# Altium footprint library IC.PcbLib: 386 footprints (part 5 of 30) (continued)
## BGA324_0.8(15X15) [mm] "BGA, 324-Leads, Body 15x15mm, Pitch 0.8mm" (continued)
Top Overlay:
  circle w0.25: c-8.15,7.35 r0.125
  region: -6.92,7.5 -7.5,6.92 -7.5,7.5
  lines w0.2: -7.5,6.92 -6.92,7.5 ; -7.5,-7.5 7.5,-7.5 7.5,7.5 -7.5,7.5 -7.5,-7.5
Mechanical 13:
  lines w0.1: -7.5,-7.5 7.5,-7.5 7.5,7.5 -7.5,7.5 -7.5,-7.5
Mechanical 15:
  lines w0.05: -8.5,-8.5 8.5,-8.5 8.5,8.5 -8.5,8.5 -8.5,-8.5
  lines w0.1: -0.5,0 0.5,0 ; 0,-0.5 0,0.5
3D body "User Library-TFBGA-324.STEP": height 1.21, standoff 0.01, extent -7.518,-7.5 7.482,7.5

## BGA324_1.0(19x19) [mm]
pads (324):
  round 0.45 smd: A1(-8.5,8.525) A2(-7.5,8.525) A3(-6.5,8.525) A4(-5.5,8.525) A5(-4.5,8.525) A6(-3.5,8.525) A7(-2.5,8.525) A8(-1.5,8.525) A9(-0.5,8.525) A10(0.5,8.525) A11(1.5,8.525) A12(2.5,8.525) A13(3.5,8.525) A14(4.5,8.525) A15(5.5,8.525) A16(6.5,8.525) A17(7.5,8.525) A18(8.5,8.525) B1(-8.5,7.525) B2(-7.5,7.525) B3(-6.5,7.525) B4(-5.5,7.525) B5(-4.5,7.525) B6(-3.5,7.525) B7(-2.5,7.525) B8(-1.5,7.525) B9(-0.5,7.525) B10(0.5,7.525) B11(1.5,7.525) B12(2.5,7.525) B13(3.5,7.525) B14(4.5,7.525) B15(5.5,7.525) B16(6.5,7.525) B17(7.5,7.525) B18(8.5,7.525) C1(-8.5,6.525) C2(-7.5,6.525) C3(-6.5,6.525) C4(-5.5,6.525) C5(-4.5,6.525) C6(-3.5,6.525) C7(-2.5,6.525) C8(-1.5,6.525) C9(-0.5,6.525) C10(0.5,6.525) C11(1.5,6.525) C12(2.5,6.525) C13(3.5,6.525) C14(4.5,6.525) C15(5.5,6.525) C16(6.5,6.525) C17(7.5,6.525) C18(8.5,6.525) D1(-8.5,5.525) D2(-7.5,5.525) D3(-6.5,5.525) D4(-5.5,5.525) D5(-4.5,5.525) D6(-3.5,5.525) D7(-2.5,5.525) D8(-1.5,5.525) D9(-0.5,5.525) D10(0.5,5.525) D11(1.5,5.525) D12(2.5,5.525) D13(3.5,5.525) D14(4.5,5.525) D15(5.5,5.525) D16(6.5,5.525) D17(7.5,5.525) D18(8.5,5.525) E1(-8.5,4.525) E2(-7.5,4.525) E3(-6.5,4.525) E4(-5.5,4.525) E5(-4.5,4.525) E6(-3.5,4.525) E7(-2.5,4.525) E8(-1.5,4.525) E9(-0.5,4.525) E10(0.5,4.525) E11(1.5,4.525) E12(2.5,4.525) E13(3.5,4.525) E14(4.5,4.525) E15(5.5,4.525) E16(6.5,4.525) E17(7.5,4.525) E18(8.5,4.525) F1(-8.5,3.525) F2(-7.5,3.525) F3(-6.5,3.525) F4(-5.5,3.525) F5(-4.5,3.525) F6(-3.5,3.525) F7(-2.5,3.525) F8(-1.5,3.525) F9(-0.5,3.525) F10(0.5,3.525) F11(1.5,3.525) F12(2.5,3.525) F13(3.5,3.525) F14(4.5,3.525) F15(5.5,3.525) F16(6.5,3.525) F17(7.5,3.525) F18(8.5,3.525) G1(-8.5,2.525) G2(-7.5,2.525) G3(-6.5,2.525) G4(-5.5,2.525) G5(-4.5,2.525) G6(-3.5,2.525) G7(-2.5,2.525) G8(-1.5,2.525) G9(-0.5,2.525) G10(0.5,2.525) G11(1.5,2.525) G12(2.5,2.525) G13(3.5,2.525) G14(4.5,2.525) G15(5.5,2.525) G16(6.5,2.525) G17(7.5,2.525) G18(8.5,2.525) H1(-8.5,1.525) H2(-7.5,1.525) H3(-6.5,1.525) H4(-5.5,1.525) H5(-4.5,1.525) H6(-3.5,1.525) H7(-2.5,1.525) H8(-1.5,1.525) H9(-0.5,1.525) H10(0.5,1.525) H11(1.5,1.525) H12(2.5,1.525) H13(3.5,1.525) H14(4.5,1.525) H15(5.5,1.525) H16(6.5,1.525) H17(7.5,1.525) H18(8.5,1.525) J1(-8.5,0.525) J2(-7.5,0.525) J3(-6.5,0.525) J4(-5.5,0.525) J5(-4.5,0.525) J6(-3.5,0.525) J7(-2.5,0.525) J8(-1.5,0.525) J9(-0.5,0.525) J10(0.5,0.525) J11(1.5,0.525) J12(2.5,0.525) J13(3.5,0.525) J14(4.5,0.525) J15(5.5,0.525) J16(6.5,0.525) J17(7.5,0.525) J18(8.5,0.525) K1(-8.5,-0.475) K2(-7.5,-0.475) K3(-6.5,-0.475) K4(-5.5,-0.475) K5(-4.5,-0.475) K6(-3.5,-0.475) K7(-2.5,-0.475) K8(-1.5,-0.475) K9(-0.5,-0.475) K10(0.5,-0.475) K11(1.5,-0.475) K12(2.5,-0.475) K13(3.5,-0.475) K14(4.5,-0.475) K15(5.5,-0.475) K16(6.5,-0.475) K17(7.5,-0.475) K18(8.5,-0.475) L1(-8.5,-1.475) L2(-7.5,-1.475) L3(-6.5,-1.475) L4(-5.5,-1.475) L5(-4.5,-1.475) L6(-3.5,-1.475) L7(-2.5,-1.475) L8(-1.5,-1.475) L9(-0.5,-1.475) L10(0.5,-1.475) L11(1.5,-1.475) L12(2.5,-1.475) L13(3.5,-1.475) L14(4.5,-1.475) L15(5.5,-1.475) L16(6.5,-1.475) L17(7.5,-1.475) L18(8.5,-1.475) M1(-8.5,-2.475) M2(-7.5,-2.475) M3(-6.5,-2.475) M4(-5.5,-2.475) M5(-4.5,-2.475) M6(-3.5,-2.475) M7(-2.5,-2.475) M8(-1.5,-2.475) M9(-0.5,-2.475) M10(0.5,-2.475) M11(1.5,-2.475) M12(2.5,-2.475) M13(3.5,-2.475) M14(4.5,-2.475) M15(5.5,-2.475) M16(6.5,-2.475) M17(7.5,-2.475) M18(8.5,-2.475) N1(-8.5,-3.475) N2(-7.5,-3.475) N3(-6.5,-3.475) N4(-5.5,-3.475) N5(-4.5,-3.475) N6(-3.5,-3.475) N7(-2.5,-3.475) N8(-1.5,-3.475) N9(-0.5,-3.475) N10(0.5,-3.475) N11(1.5,-3.475) N12(2.5,-3.475) N13(3.5,-3.475) N14(4.5,-3.475) N15(5.5,-3.475) N16(6.5,-3.475) N17(7.5,-3.475) N18(8.5,-3.475) P1(-8.5,-4.475) P2(-7.5,-4.475) P3(-6.5,-4.475) P4(-5.5,-4.475) P5(-4.5,-4.475) P6(-3.5,-4.475) P7(-2.5,-4.475) P8(-1.5,-4.475) P9(-0.5,-4.475) P10(0.5,-4.475) P11(1.5,-4.475) P12(2.5,-4.475) P13(3.5,-4.475) P14(4.5,-4.475) P15(5.5,-4.475) P16(6.5,-4.475) P17(7.5,-4.475) P18(8.5,-4.475) R1(-8.5,-5.475) R2(-7.5,-5.475) R3(-6.5,-5.475) R4(-5.5,-5.475) R5(-4.5,-5.475) R6(-3.5,-5.475) R7(-2.5,-5.475) R8(-1.5,-5.475) R9(-0.5,-5.475) R10(0.5,-5.475) R11(1.5,-5.475) R12(2.5,-5.475) R13(3.5,-5.475) R14(4.5,-5.475) R15(5.5,-5.475) R16(6.5,-5.475) R17(7.5,-5.475) R18(8.5,-5.475) T1(-8.5,-6.475) T2(-7.5,-6.475) T3(-6.5,-6.475) T4(-5.5,-6.475) T5(-4.5,-6.475) T6(-3.5,-6.475) T7(-2.5,-6.475) T8(-1.5,-6.475) T9(-0.5,-6.475) T10(0.5,-6.475) T11(1.5,-6.475) T12(2.5,-6.475) T13(3.5,-6.475) T14(4.5,-6.475) T15(5.5,-6.475) T16(6.5,-6.475) T17(7.5,-6.475) T18(8.5,-6.475) U1(-8.5,-7.475) U2(-7.5,-7.475) U3(-6.5,-7.475) U4(-5.5,-7.475) U5(-4.5,-7.475) U6(-3.5,-7.475) U7(-2.5,-7.475) U8(-1.5,-7.475) U9(-0.5,-7.475) U10(0.5,-7.475) U11(1.5,-7.475) U12(2.5,-7.475) U13(3.5,-7.475) U14(4.5,-7.475) U15(5.5,-7.475) U16(6.5,-7.475) U17(7.5,-7.475) U18(8.5,-7.475) V1(-8.5,-8.475) V2(-7.5,-8.475) V3(-6.5,-8.475) V4(-5.5,-8.475) V5(-4.5,-8.475) V6(-3.5,-8.475) V7(-2.5,-8.475) V8(-1.5,-8.475) V9(-0.5,-8.475) V10(0.5,-8.475) V11(1.5,-8.475) V12(2.5,-8.475) V13(3.5,-8.475) V14(4.5,-8.475) V15(5.5,-8.475) V16(6.5,-8.475) V17(7.5,-8.475) V18(8.5,-8.475)
Top Overlay:
  circle w0.25: c-10.15,9.375 r0.125
  region: -8.5,9.525 -9.5,8.525 -9.5,9.525
  lines w0.2: -9.5,8.525 -8.5,9.525 ; -9.5,-9.475 -9.5,9.525 9.5,9.525 9.5,-9.475 -9.5,-9.475
Mechanical 13:
  lines w0.1: -9.5,-9.475 -9.5,9.525 9.5,9.525 9.5,-9.475 -9.5,-9.475
Mechanical 15:
  lines w0.05: -10,-9.975 -10,10.025 10,10.025 10,-9.975 -10,-9.975
  lines w0.1: -0.5,0.025 0.5,0.025 ; 0,-0.475 0,0.525
3D body "BGA324C100P18X18_1900X1900X150.step": height 1.5, standoff 0, extent -9.525,-9.5 9.475,9.5

## BGA400_0.8(17x17) [mm]
height 1
pads (400):
  round 0.45 smd: A1(-7.575,7.6) A2(-6.775,7.6) A3(-5.975,7.6) A4(-5.175,7.6) A5(-4.375,7.6) A6(-3.575,7.6) A7(-2.775,7.6) A8(-1.975,7.6) A9(-1.175,7.6) A10(-0.375,7.6) A11(0.425,7.6) A12(1.225,7.6) A13(2.025,7.6) A14(2.825,7.6) A15(3.625,7.6) A16(4.425,7.6) A17(5.225,7.6) A18(6.025,7.6) A19(6.825,7.6) A20(7.625,7.6) B1(-7.575,6.8) B2(-6.775,6.8) B3(-5.975,6.8) B4(-5.175,6.8) B5(-4.375,6.8) B6(-3.575,6.8) B7(-2.775,6.8) B8(-1.975,6.8) B9(-1.175,6.8) B10(-0.375,6.8) B11(0.425,6.8) B12(1.225,6.8) B13(2.025,6.8) B14(2.825,6.8) B15(3.625,6.8) B16(4.425,6.8) B17(5.225,6.8) B18(6.025,6.8) B19(6.825,6.8) B20(7.625,6.8) C1(-7.575,6) C2(-6.775,6) C3(-5.975,6) C4(-5.175,6) C5(-4.375,6) C6(-3.575,6) C7(-2.775,6) C8(-1.975,6) C9(-1.175,6) C10(-0.375,6) C11(0.425,6) C12(1.225,6) C13(2.025,6) C14(2.825,6) C15(3.625,6) C16(4.425,6) C17(5.225,6) C18(6.025,6) C19(6.825,6) C20(7.625,6) D1(-7.575,5.2) D2(-6.775,5.2) D3(-5.975,5.2) D4(-5.175,5.2) D5(-4.375,5.2) D6(-3.575,5.2) D7(-2.775,5.2) D8(-1.975,5.2) D9(-1.175,5.2) D10(-0.375,5.2) D11(0.425,5.2) D12(1.225,5.2) D13(2.025,5.2) D14(2.825,5.2) D15(3.625,5.2) D16(4.425,5.2) D17(5.225,5.2) D18(6.025,5.2) D19(6.825,5.2) D20(7.625,5.2) E1(-7.575,4.4) E2(-6.775,4.4) E3(-5.975,4.4) E4(-5.175,4.4) E5(-4.375,4.4) E6(-3.575,4.4) E7(-2.775,4.4) E8(-1.975,4.4) E9(-1.175,4.4) E10(-0.375,4.4) E11(0.425,4.4) E12(1.225,4.4) E13(2.025,4.4) E14(2.825,4.4) E15(3.625,4.4) E16(4.425,4.4) E17(5.225,4.4) E18(6.025,4.4) E19(6.825,4.4) E20(7.625,4.4) F1(-7.575,3.6) F2(-6.775,3.6) F3(-5.975,3.6) F4(-5.175,3.6) F5(-4.375,3.6) F6(-3.575,3.6) F7(-2.775,3.6) F8(-1.975,3.6) F9(-1.175,3.6) F10(-0.375,3.6) F11(0.425,3.6) F12(1.225,3.6) F13(2.025,3.6) F14(2.825,3.6) F15(3.625,3.6) F16(4.425,3.6) F17(5.225,3.6) F18(6.025,3.6) F19(6.825,3.6) F20(7.625,3.6) G1(-7.575,2.8) G2(-6.775,2.8) G3(-5.975,2.8) G4(-5.175,2.8) G5(-4.375,2.8) G6(-3.575,2.8) G7(-2.775,2.8) G8(-1.975,2.8) G9(-1.175,2.8) G10(-0.375,2.8) G11(0.425,2.8) G12(1.225,2.8) G13(2.025,2.8) G14(2.825,2.8) G15(3.625,2.8) G16(4.425,2.8) G17(5.225,2.8) G18(6.025,2.8) G19(6.825,2.8) G20(7.625,2.8) H1(-7.575,2) H2(-6.775,2) H3(-5.975,2) H4(-5.175,2) H5(-4.375,2) H6(-3.575,2) H7(-2.775,2) H8(-1.975,2) H9(-1.175,2) H10(-0.375,2) H11(0.425,2) H12(1.225,2) H13(2.025,2) H14(2.825,2) H15(3.625,2) H16(4.425,2) H17(5.225,2) H18(6.025,2) H19(6.825,2) H20(7.625,2) J1(-7.575,1.2) J2(-6.775,1.2) J3(-5.975,1.2) J4(-5.175,1.2) J5(-4.375,1.2) J6(-3.575,1.2) J7(-2.775,1.2) J8(-1.975,1.2) J9(-1.175,1.2) J10(-0.375,1.2) J11(0.425,1.2) J12(1.225,1.2) J13(2.025,1.2) J14(2.825,1.2) J15(3.625,1.2) J16(4.425,1.2) J17(5.225,1.2) J18(6.025,1.2) J19(6.825,1.2) J20(7.625,1.2) K1(-7.575,0.4) K2(-6.775,0.4) K3(-5.975,0.4) K4(-5.175,0.4) K5(-4.375,0.4) K6(-3.575,0.4) K7(-2.775,0.4) K8(-1.975,0.4) K9(-1.175,0.4) K10(-0.375,0.4) K11(0.425,0.4) K12(1.225,0.4) K13(2.025,0.4) K14(2.825,0.4) K15(3.625,0.4) K16(4.425,0.4) K17(5.225,0.4) K18(6.025,0.4) K19(6.825,0.4) K20(7.625,0.4) L1(-7.575,-0.4) L2(-6.775,-0.4) L3(-5.975,-0.4) L4(-5.175,-0.4) L5(-4.375,-0.4) L6(-3.575,-0.4) L7(-2.775,-0.4) L8(-1.975,-0.4) L9(-1.175,-0.4) L10(-0.375,-0.4) L11(0.425,-0.4) L12(1.225,-0.4) L13(2.025,-0.4) L14(2.825,-0.4) L15(3.625,-0.4) L16(4.425,-0.4) L17(5.225,-0.4) L18(6.025,-0.4) L19(6.825,-0.4) L20(7.625,-0.4) M1(-7.575,-1.2) M2(-6.775,-1.2) M3(-5.975,-1.2) M4(-5.175,-1.2) M5(-4.375,-1.2) M6(-3.575,-1.2) M7(-2.775,-1.2) M8(-1.975,-1.2) M9(-1.175,-1.2) M10(-0.375,-1.2) M11(0.425,-1.2) M12(1.225,-1.2) M13(2.025,-1.2) M14(2.825,-1.2) M15(3.625,-1.2) M16(4.425,-1.2) M17(5.225,-1.2) M18(6.025,-1.2) M19(6.825,-1.2) M20(7.625,-1.2) N1(-7.575,-2) N2(-6.775,-2) N3(-5.975,-2) N4(-5.175,-2) N5(-4.375,-2) N6(-3.575,-2) N7(-2.775,-2) N8(-1.975,-2) N9(-1.175,-2) N10(-0.375,-2) N11(0.425,-2) N12(1.225,-2) N13(2.025,-2) N14(2.825,-2) N15(3.625,-2) N16(4.425,-2) N17(5.225,-2) N18(6.025,-2) N19(6.825,-2) N20(7.625,-2) P1(-7.575,-2.8) P2(-6.775,-2.8) P3(-5.975,-2.8) P4(-5.175,-2.8) P5(-4.375,-2.8) P6(-3.575,-2.8) P7(-2.775,-2.8) P8(-1.975,-2.8) P9(-1.175,-2.8) P10(-0.375,-2.8) P11(0.425,-2.8) P12(1.225,-2.8) P13(2.025,-2.8) P14(2.825,-2.8) P15(3.625,-2.8) P16(4.425,-2.8) P17(5.225,-2.8) P18(6.025,-2.8) P19(6.825,-2.8) P20(7.625,-2.8) R1(-7.575,-3.6) R2(-6.775,-3.6) R3(-5.975,-3.6) R4(-5.175,-3.6) R5(-4.375,-3.6) R6(-3.575,-3.6) R7(-2.775,-3.6) R8(-1.975,-3.6) R9(-1.175,-3.6) R10(-0.375,-3.6) R11(0.425,-3.6) R12(1.225,-3.6) R13(2.025,-3.6) R14(2.825,-3.6) R15(3.625,-3.6) R16(4.425,-3.6) R17(5.225,-3.6) R18(6.025,-3.6) R19(6.825,-3.6) R20(7.625,-3.6) T1(-7.575,-4.4) T2(-6.775,-4.4) T3(-5.975,-4.4) T4(-5.175,-4.4) T5(-4.375,-4.4) T6(-3.575,-4.4) T7(-2.775,-4.4) T8(-1.975,-4.4) T9(-1.175,-4.4) T10(-0.375,-4.4) T11(0.425,-4.4) T12(1.225,-4.4) T13(2.025,-4.4) T14(2.825,-4.4) T15(3.625,-4.4) T16(4.425,-4.4) T17(5.225,-4.4) T18(6.025,-4.4) T19(6.825,-4.4) T20(7.625,-4.4) U1(-7.575,-5.2) U2(-6.775,-5.2) U3(-5.975,-5.2) U4(-5.175,-5.2) U5(-4.375,-5.2) U6(-3.575,-5.2) U7(-2.775,-5.2) U8(-1.975,-5.2) U9(-1.175,-5.2) U10(-0.375,-5.2) U11(0.425,-5.2) U12(1.225,-5.2) U13(2.025,-5.2) U14(2.825,-5.2) U15(3.625,-5.2) U16(4.425,-5.2) U17(5.225,-5.2) U18(6.025,-5.2) U19(6.825,-5.2) U20(7.625,-5.2) V1(-7.575,-6) V2(-6.775,-6) V3(-5.975,-6) V4(-5.175,-6) V5(-4.375,-6) V6(-3.575,-6) V7(-2.775,-6) V8(-1.975,-6) V9(-1.175,-6) V10(-0.375,-6) V11(0.425,-6) V12(1.225,-6) V13(2.025,-6) V14(2.825,-6) V15(3.625,-6) V16(4.425,-6) V17(5.225,-6) V18(6.025,-6) V19(6.825,-6) V20(7.625,-6) W1(-7.575,-6.8) W2(-6.775,-6.8) W3(-5.975,-6.8) W4(-5.175,-6.8) W5(-4.375,-6.8) W6(-3.575,-6.8) W7(-2.775,-6.8) W8(-1.975,-6.8) W9(-1.175,-6.8) W10(-0.375,-6.8) W11(0.425,-6.8) W12(1.225,-6.8) W13(2.025,-6.8) W14(2.825,-6.8) W15(3.625,-6.8) W16(4.425,-6.8) W17(5.225,-6.8) W18(6.025,-6.8) W19(6.825,-6.8) W20(7.625,-6.8) Y1(-7.575,-7.6) Y2(-6.775,-7.6) Y3(-5.975,-7.6) Y4(-5.175,-7.6) Y5(-4.375,-7.6) Y6(-3.575,-7.6) Y7(-2.775,-7.6) Y8(-1.975,-7.6) Y9(-1.175,-7.6) Y10(-0.375,-7.6) Y11(0.425,-7.6) Y12(1.225,-7.6) Y13(2.025,-7.6) Y14(2.825,-7.6) Y15(3.625,-7.6) Y16(4.425,-7.6) Y17(5.225,-7.6) Y18(6.025,-7.6) Y19(6.825,-7.6) Y20(7.625,-7.6)
Top Overlay:
  circle w0.25: c-9.125,8.35 r0.125
  region: -7.558,8.5 -8.475,7.584 -8.475,8.5
  lines w0.2: -8.475,7.584 -7.558,8.5 ; -8.475,-8.5 8.525,-8.5 8.525,8.5 -8.475,8.5 -8.475,-8.5
Mechanical 13:
  lines w0.1: -8.475,-8.5 8.525,-8.5 8.525,8.5 -8.475,8.5 -8.475,-8.5
Mechanical 15:
  lines w0.05: -8.975,-9 9.025,-9 9.025,9 -8.975,9 -8.975,-9
  lines w0.1: -0.475,0 0.525,0 ; 0.025,-0.5 0.025,0.5
3D body "BGA400C80P20X20_1700X1700X150.step": height 1.5, standoff 0, extent -8.525,-8.475 8.475,8.525

## BGA484_0.5(15x15) [mm]
pads (484):
  round 0.25 smd: A1(-6.775,6.775) A2(-6.275,6.775) A3(-5.775,6.775) A4(-5.275,6.775) A5(-4.775,6.775) A7(-3.775,6.775) A8(-3.275,6.775) A9(-2.775,6.775) A10(-2.275,6.775) A12(-1.275,6.775) A13(-0.775,6.775) A16(0.725,6.775) A17(1.225,6.775) A19(2.225,6.775) A20(2.725,6.775) A21(3.225,6.775) A22(3.725,6.775) A24(4.725,6.775) A25(5.225,6.775) A26(5.725,6.775) A27(6.225,6.775) A28(6.725,6.775) AA1(-6.775,-3.225) AA3(-5.775,-3.225) AA4(-5.275,-3.225) AA5(-4.775,-3.225) AA6(-4.275,-3.225) AA7(-3.775,-3.225) AA8(-3.275,-3.225) AA9(-2.775,-3.225) AA10(-2.275,-3.225) AA12(-1.275,-3.225) AA13(-0.775,-3.225) AA16(0.725,-3.225) AA17(1.225,-3.225) AA19(2.225,-3.225) AA20(2.725,-3.225) AA21(3.225,-3.225) AA22(3.725,-3.225) AA23(4.225,-3.225) AA24(4.725,-3.225) AA25(5.225,-3.225) AA26(5.725,-3.225) AA28(6.725,-3.225) AB1(-6.775,-3.725) AB3(-5.775,-3.725) AB4(-5.275,-3.725) AB5(-4.775,-3.725) AB6(-4.275,-3.725) AB7(-3.775,-3.725) AB8(-3.275,-3.725) AB9(-2.775,-3.725) AB10(-2.275,-3.725) AB12(-1.275,-3.725) AB13(-0.775,-3.725) AB16(0.725,-3.725) AB17(1.225,-3.725) AB19(2.225,-3.725) AB20(2.725,-3.725) AB21(3.225,-3.725) AB22(3.725,-3.725) AB23(4.225,-3.725) AB24(4.725,-3.725) AB25(5.225,-3.725) AB26(5.725,-3.725) AB28(6.725,-3.725) AC1(-6.775,-4.225) AC7(-3.775,-4.225) AC8(-3.275,-4.225) AC9(-2.775,-4.225) AC10(-2.275,-4.225) AC12(-1.275,-4.225) AC13(-0.775,-4.225) AC16(0.725,-4.225) AC17(1.225,-4.225) AC19(2.225,-4.225) AC20(2.725,-4.225) AC21(3.225,-4.225) AC22(3.725,-4.225) AC28(6.725,-4.225) AD1(-6.775,-4.725) AD3(-5.775,-4.725) AD4(-5.275,-4.725) AD5(-4.775,-4.725) AD7(-3.775,-4.725) AD8(-3.275,-4.725) AD9(-2.775,-4.725) AD10(-2.275,-4.725) AD12(-1.275,-4.725) AD13(-0.775,-4.725) AD16(0.725,-4.725) AD17(1.225,-4.725) AD19(2.225,-4.725) AD20(2.725,-4.725) AD21(3.225,-4.725) AD22(3.725,-4.725) AD24(4.725,-4.725) AD25(5.225,-4.725) AD26(5.725,-4.725) AD28(6.725,-4.725) AE1(-6.775,-5.225) AE3(-5.775,-5.225) AE4(-5.275,-5.225) AE5(-4.775,-5.225) AE7(-3.775,-5.225) AE8(-3.275,-5.225) AE9(-2.775,-5.225) AE10(-2.275,-5.225) AE12(-1.275,-5.225) AE13(-0.775,-5.225) AE16(0.725,-5.225) AE17(1.225,-5.225) AE19(2.225,-5.225) AE20(2.725,-5.225) AE21(3.225,-5.225) AE22(3.725,-5.225) AE24(4.725,-5.225) AE25(5.225,-5.225) AE26(5.725,-5.225) AE28(6.725,-5.225) AF1(-6.775,-5.725) AF3(-5.775,-5.725) AF4(-5.275,-5.725) AF5(-4.775,-5.725) AF7(-3.775,-5.725) AF8(-3.275,-5.725) AF9(-2.775,-5.725) AF10(-2.275,-5.725) AF12(-1.275,-5.725) AF13(-0.775,-5.725) AF16(0.725,-5.725) AF17(1.225,-5.725) AF19(2.225,-5.725) AF20(2.725,-5.725) AF21(3.225,-5.725) AF22(3.725,-5.725) AF24(4.725,-5.725) AF25(5.225,-5.725) AF26(5.725,-5.725) AF28(6.725,-5.725) AG1(-6.775,-6.225) AG28(6.725,-6.225) AH1(-6.775,-6.725) AH2(-6.275,-6.725) AH3(-5.775,-6.725) AH4(-5.275,-6.725) AH5(-4.775,-6.725) AH7(-3.775,-6.725) AH8(-3.275,-6.725) AH9(-2.775,-6.725) AH10(-2.275,-6.725) AH12(-1.275,-6.725) AH13(-0.775,-6.725) AH16(0.725,-6.725) AH17(1.225,-6.725) AH19(2.225,-6.725) AH20(2.725,-6.725) AH21(3.225,-6.725) AH22(3.725,-6.725) AH24(4.725,-6.725) AH25(5.225,-6.725) AH26(5.725,-6.725) AH27(6.225,-6.725) AH28(6.725,-6.725) B1(-6.775,6.275) B28(6.725,6.275) C1(-6.775,5.775) C3(-5.775,5.775) C4(-5.275,5.775) C5(-4.775,5.775) C7(-3.775,5.775) C8(-3.275,5.775) C9(-2.775,5.775) C10(-2.275,5.775) C12(-1.275,5.775) C13(-0.775,5.775) C16(0.725,5.775) C17(1.225,5.775) C19(2.225,5.775) C20(2.725,5.775) C21(3.225,5.775) C22(3.725,5.775) C24(4.725,5.775) C25(5.225,5.775) C26(5.725,5.775) C28(6.725,5.775) D1(-6.775,5.275) D3(-5.775,5.275) D4(-5.275,5.275) D5(-4.775,5.275) D7(-3.775,5.275) D8(-3.275,5.275) D9(-2.775,5.275) D10(-2.275,5.275) D12(-1.275,5.275) D13(-0.775,5.275) D16(0.725,5.275) D17(1.225,5.275) D19(2.225,5.275) D20(2.725,5.275) D21(3.225,5.275) D22(3.725,5.275) D24(4.725,5.275) D25(5.225,5.275) D26(5.725,5.275) D28(6.725,5.275) E1(-6.775,4.775) E3(-5.775,4.775) E4(-5.275,4.775) E5(-4.775,4.775) E7(-3.775,4.775) E8(-3.275,4.775) E9(-2.775,4.775) E10(-2.275,4.775) E12(-1.275,4.775) E13(-0.775,4.775) E16(0.725,4.775) E17(1.225,4.775) E19(2.225,4.775) E20(2.725,4.775) E21(3.225,4.775) E22(3.725,4.775) E24(4.725,4.775) E25(5.225,4.775) E26(5.725,4.775) E28(6.725,4.775) F1(-6.775,4.275) F7(-3.775,4.275) F8(-3.275,4.275) F9(-2.775,4.275) F10(-2.275,4.275) F12(-1.275,4.275) F13(-0.775,4.275) F16(0.725,4.275) F17(1.225,4.275) F19(2.225,4.275) F20(2.725,4.275) F21(3.225,4.275) F22(3.725,4.275) F28(6.725,4.275) G1(-6.775,3.775) G3(-5.775,3.775) G4(-5.275,3.775) G5(-4.775,3.775) G6(-4.275,3.775) G7(-3.775,3.775) G8(-3.275,3.775) G9(-2.775,3.775) G10(-2.275,3.775) G12(-1.275,3.775) G13(-0.775,3.775) G16(0.725,3.775) G17(1.225,3.775) G19(2.225,3.775) G20(2.725,3.775) G21(3.225,3.775) G22(3.725,3.775) G23(4.225,3.775) G24(4.725,3.775) G25(5.225,3.775) G26(5.725,3.775) G28(6.725,3.775) H1(-6.775,3.275) H3(-5.775,3.275) H4(-5.275,3.275) H5(-4.775,3.275) H6(-4.275,3.275) H7(-3.775,3.275) H8(-3.275,3.275) H9(-2.775,3.275) H10(-2.275,3.275) H12(-1.275,3.275) H13(-0.775,3.275) H16(0.725,3.275) H17(1.225,3.275) H19(2.225,3.275) H20(2.725,3.275) H21(3.225,3.275) H22(3.725,3.275) H23(4.225,3.275) H24(4.725,3.275) H25(5.225,3.275) H26(5.725,3.275) H28(6.725,3.275) J1(-6.775,2.775) J3(-5.775,2.775) J4(-5.275,2.775) J5(-4.775,2.775) J6(-4.275,2.775) J7(-3.775,2.775) J8(-3.275,2.775) J9(-2.775,2.775) J10(-2.275,2.775) J12(-1.275,2.775) J13(-0.775,2.775) J16(0.725,2.775) J17(1.225,2.775) J19(2.225,2.775) J20(2.725,2.775) J21(3.225,2.775) J22(3.725,2.775) J23(4.225,2.775) J24(4.725,2.775) J25(5.225,2.775) J26(5.725,2.775) J28(6.725,2.775) K1(-6.775,2.275) K3(-5.775,2.275) K4(-5.275,2.275) K5(-4.775,2.275) K6(-4.275,2.275) K7(-3.775,2.275) K8(-3.275,2.275) K9(-2.775,2.275) K10(-2.275,2.275) K12(-1.275,2.275) K13(-0.775,2.275) K16(0.725,2.275) K17(1.225,2.275) K19(2.225,2.275) K20(2.725,2.275) K21(3.225,2.275) K22(3.725,2.275) K23(4.225,2.275) K24(4.725,2.275) K25(5.225,2.275) K26(5.725,2.275) K28(6.725,2.275) L1(-6.775,1.775) L11(-1.775,1.775) L12(-1.275,1.775) L13(-0.775,1.775) L16(0.725,1.775) L17(1.225,1.775) L18(1.725,1.775) L28(6.725,1.775) M1(-6.775,1.275) M3(-5.775,1.275) M4(-5.275,1.275) M5(-4.775,1.275) M6(-4.275,1.275) M7(-3.775,1.275) M8(-3.275,1.275) M9(-2.775,1.275) M10(-2.275,1.275) M11(-1.775,1.275) M12(-1.275,1.275) M13(-0.775,1.275) M16(0.725,1.275) M17(1.225,1.275) M18(1.725,1.275) M19(2.225,1.275) M20(2.725,1.275) M21(3.225,1.275) M22(3.725,1.275) M23(4.225,1.275) M24(4.725,1.275) M25(5.225,1.275) M26(5.725,1.275) M28(6.725,1.275) N1(-6.775,0.775) N3(-5.775,0.775) N4(-5.275,0.775) N5(-4.775,0.775) N6(-4.275,0.775) N7(-3.775,0.775) N8(-3.275,0.775) N9(-2.775,0.775) N10(-2.275,0.775) N11(-1.775,0.775) N12(-1.275,0.775) N13(-0.775,0.775) N16(0.725,0.775) N17(1.225,0.775) N18(1.725,0.775) N19(2.225,0.775) N20(2.725,0.775) N21(3.225,0.775) N22(3.725,0.775) N23(4.225,0.775) N24(4.725,0.775) N25(5.225,0.775) N26(5.725,0.775) N28(6.725,0.775) T1(-6.775,-0.725) T3(-5.775,-0.725) T4(-5.275,-0.725) T5(-4.775,-0.725) T6(-4.275,-0.725) T7(-3.775,-0.725) T8(-3.275,-0.725) T9(-2.775,-0.725) T10(-2.275,-0.725) T11(-1.775,-0.725) T12(-1.275,-0.725) T13(-0.775,-0.725) T16(0.725,-0.725) T17(1.225,-0.725) T18(1.725,-0.725) T19(2.225,-0.725) T20(2.725,-0.725) T21(3.225,-0.725) T22(3.725,-0.725) T23(4.225,-0.725) T24(4.725,-0.725) T25(5.225,-0.725) T26(5.725,-0.725) T28(6.725,-0.725) U1(-6.775,-1.225) U3(-5.775,-1.225) U4(-5.275,-1.225) U5(-4.775,-1.225) U6(-4.275,-1.225) U7(-3.775,-1.225) U8(-3.275,-1.225) U9(-2.775,-1.225) U10(-2.275,-1.225) U11(-1.775,-1.225) U12(-1.275,-1.225) U13(-0.775,-1.225) U16(0.725,-1.225) U17(1.225,-1.225) U18(1.725,-1.225) U19(2.225,-1.225) U20(2.725,-1.225) U21(3.225,-1.225) U22(3.725,-1.225) U23(4.225,-1.225) U24(4.725,-1.225) U25(5.225,-1.225) U26(5.725,-1.225) U28(6.725,-1.225) V1(-6.775,-1.725) V11(-1.775,-1.725) V12(-1.275,-1.725) V13(-0.775,-1.725) V16(0.725,-1.725) V17(1.225,-1.725) V18(1.725,-1.725) V28(6.725,-1.725) W1(-6.775,-2.225) W3(-5.775,-2.225) W4(-5.275,-2.225) W5(-4.775,-2.225) W6(-4.275,-2.225) W7(-3.775,-2.225) W8(-3.275,-2.225) W9(-2.775,-2.225) W10(-2.275,-2.225) W12(-1.275,-2.225) W13(-0.775,-2.225) W16(0.725,-2.225) W17(1.225,-2.225) W19(2.225,-2.225) W20(2.725,-2.225) W21(3.225,-2.225) W22(3.725,-2.225) W23(4.225,-2.225) W24(4.725,-2.225) W25(5.225,-2.225) W26(5.725,-2.225) W28(6.725,-2.225) Y1(-6.775,-2.725) Y3(-5.775,-2.725) Y4(-5.275,-2.725) Y5(-4.775,-2.725) Y6(-4.275,-2.725) Y7(-3.775,-2.725) Y8(-3.275,-2.725) Y9(-2.775,-2.725) Y10(-2.275,-2.725) Y12(-1.275,-2.725) Y13(-0.775,-2.725) Y16(0.725,-2.725) Y17(1.225,-2.725) Y19(2.225,-2.725) Y20(2.725,-2.725) Y21(3.225,-2.725) Y22(3.725,-2.725) Y23(4.225,-2.725) Y24(4.725,-2.725) Y25(5.225,-2.725) Y26(5.725,-2.725) Y28(6.725,-2.725)
Top Overlay:
  circle w0.25: c-8.175,7.375 r0.125
  region: -6.768,7.525 -7.525,6.768 -7.525,7.525
  lines w0.2: -7.525,6.768 -6.768,7.525 ; -7.525,-7.475 -7.525,7.525 7.475,7.525 7.475,-7.475 -7.525,-7.475
Mechanical 13:
  lines w0.1: -7.525,-7.475 -7.525,7.525 7.475,7.525 7.475,-7.475 -7.525,-7.475
Mechanical 15:
  lines w0.05: -8.025,-7.975 -8.025,8.025 7.975,8.025 7.975,-7.975 -8.025,-7.975
  lines w0.1: -0.525,0.025 0.475,0.025 ; -0.025,-0.475 -0.025,0.525
3D body: height 1.25, standoff 0.17, extent -7.525,-7.475 7.475,7.525
3D body: height 1.3, standoff 0.4, extent -6.772,6.002 -5.975,6.8